# Altium footprint library Footprints.PcbLib: 207 footprints (part 2 of 13)
Each footprint in its own frame and in the unit in brackets; x right, y up, seen from the top. Pads: shape width x height; smd on the part's side, far side on the other; paste and mask are expansions set on the pad; w line width, h text height; cw(c..) or ccw(c..) is an arc to the next point about the centre after c.
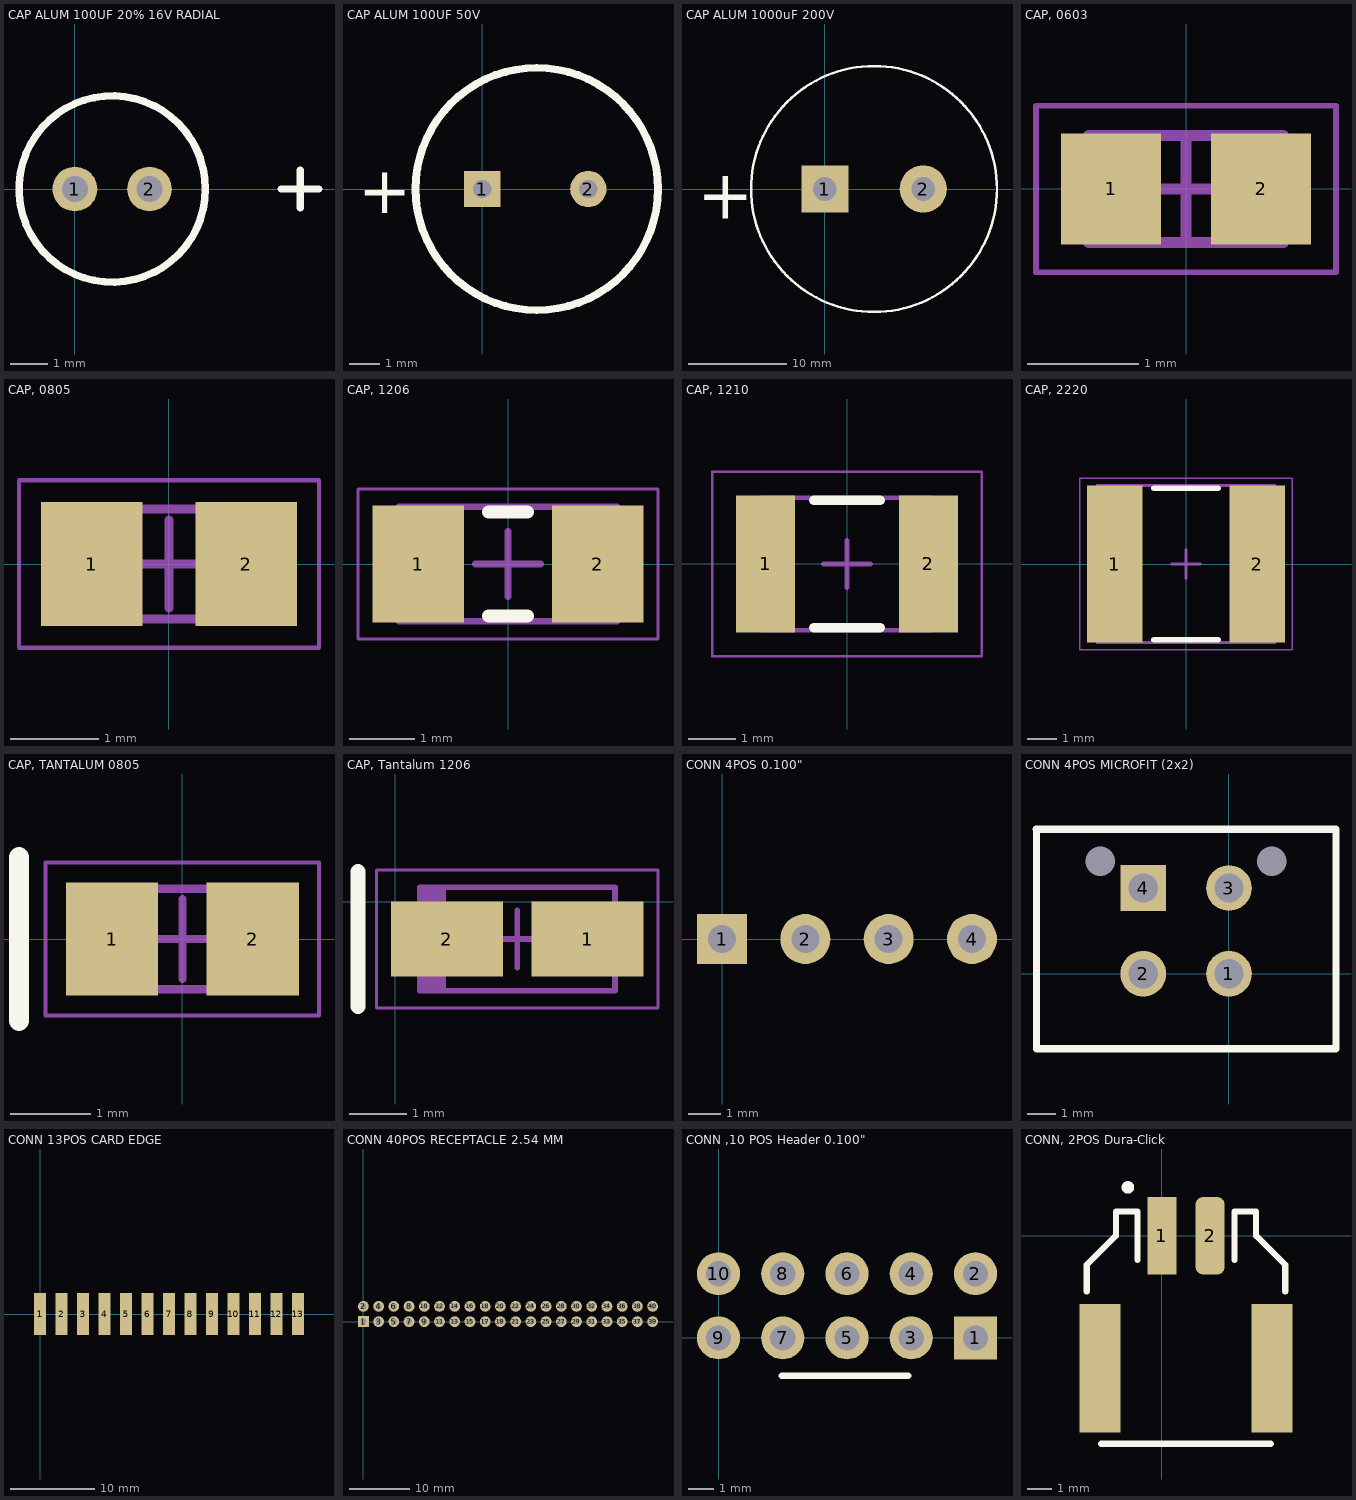
[diagram p1: the footprints below, top view; thin cyan lines are the x and y axes]

## CAP ALUM 100UF 20% 16V RADIAL [mm] "100µF 16V Aluminum Capacitors Radial, Can 2000 Hrs @ 105°C"
height 12.5
pads (2):
  round 1.2 hole 0.7: 1(0,0) 2(2,0)
Top Overlay:
  circle w0.2: c1,0 r2.5
  lines w0.2: 5.532,0 6.548,0 ; 6.04,-0.508 6.04,0.508

## CAP ALUM 100UF 50V [mm] "CAP ALUM 100UF 20% 50V RADIAL"
height 11
pads (2):
  rect 1.2x1.2 hole 0.6: 1(0,0)
  round 1.2 hole 0.6: 2(3.5,0)
Top Overlay:
  circle w0.254: c1.8,0 r4
  text "+" at -4.1,-0.8 h1.52
3D body "ESY107M050AG3AA.step": height 12.5, standoff -5, extent -2.45,-4.25 6.05,4.25

## CAP ALUM 1000uF 200V [mm] "Footprint for 1000µF 200V Aluminum Electrolytic Capacitors Radial, Can - Snap-In 199mOhm @ 120Hz 3000 Hrs @ 85°C"
height 45
pads (2):
  rect 4.8x4.8 hole 2.4: 1(0,0)
  round 4.8 hole 2.4: 2(10,0)
Top Overlay:
  circle w0.254: c5,0 r12.5
  text "+" at -13,-3 h5
3D body: height 45, standoff 0, extent -8,-12.989 18,13

## CAP, 0603 [mm] "Chip Capacitor, 2-Leads, Body 1.60x0.81mm, IPC Medium Density"
height 0.9
pads (2):
  rect 0.9x1 smd mask+0.076: 1(-0.675,0) 2(0.675,0)
Mechanical 13:
  lines w0.1: -0.875,-0.48 -0.875,0.48 0.875,0.48 0.875,-0.48 -0.875,-0.48
Mechanical 15:
  lines w0.05: -1.35,-0.75 -1.35,0.75 1.35,0.75 1.35,-0.75 -1.35,-0.75
  lines w0.1: -0.48,0 0.48,0 ; 0,-0.48 0,0.48
3D body "CAPC1608X09N.step": height 0.9, standoff 0, extent -0.875,-0.48 0.875,0.48

## CAP, 0805 [mm] "Chip Capacitor, 2-Leads, Body 2.00x1.25mm, IPC Medium Density"
height 1.25
pads (2):
  rect 1.15x1.4 smd: 1(-0.875,0) 2(0.875,0)
Mechanical 13:
  lines w0.1: -1,-0.625 1,-0.625 1,0.625 -1,0.625 -1,-0.625
Mechanical 15:
  lines w0.05: -1.7,-0.95 1.7,-0.95 1.7,0.95 -1.7,0.95 -1.7,-0.95
  lines w0.1: -0.5,0 0.5,0 ; 0,-0.5 0,0.5
3D body "CAP, 0805.step": height 1.25, standoff 0, extent -1,-0.625 1,0.625

## CAP, 1206 [mm] "Chip Capacitor, 2-Leads, Body 3.20x1.60mm, IPC Medium Density"
height 1.8
pads (2):
  rect 1.4x1.8 smd: 1(-1.375,0) 2(1.375,0)
Top Overlay:
  lines w0.2: -0.3,-0.8 0.3,-0.8 ; -0.3,0.8 0.3,0.8
Mechanical 13:
  lines w0.1: -1.675,-0.875 1.675,-0.875 1.675,0.875 -1.675,0.875 -1.675,-0.875
Mechanical 15:
  lines w0.05: -2.3,-1.15 2.3,-1.15 2.3,1.15 -2.3,1.15 -2.3,-1.15
  lines w0.1: -0.5,0 0.5,0 ; 0,-0.5 0,0.5
3D body: height 1.8, standoff 0, extent 1.125,-0.875 1.675,0.875
3D body: height 1.8, standoff 0, extent -1.675,-0.875 -1.125,0.875
3D body: height 1.8, standoff 0, extent -1.125,-0.875 1.125,0.875

## CAP, 1210 [mm] "Chip Capacitor, 2-Leads, Body 3.20x2.50mm, IPC Low Density"
height 2.8
pads (2):
  rect 1.25x2.9 smd: 1(-1.725,0) 2(1.725,0)
Top Overlay:
  lines w0.2: -0.7,-1.35 0.7,-1.35 ; -0.7,1.35 0.7,1.35
Mechanical 13:
  lines w0.1: -1.8,-1.4 1.8,-1.4 1.8,1.4 -1.8,1.4 -1.8,-1.4
Mechanical 15:
  lines w0.05: -2.85,-1.95 2.85,-1.95 2.85,1.95 -2.85,1.95 -2.85,-1.95
  lines w0.1: -0.5,0 0.5,0 ; 0,-0.5 0,0.5
3D body "CAPC3225X28M.step": height 2.8, standoff 0, extent -1.8,-1.4 1.8,1.4

## CAP, 2220 [mm] "Chip Capacitor, 2-Leads, Body 5.70x5.00mm, IPC Medium Density"
height 2.3
pads (2):
  rect 1.9x5.4 smd: 1(-2.45,0) 2(2.45,0)
Top Overlay:
  lines w0.2: -1.1,-2.6 1.1,-2.6 ; -1.1,2.6 1.1,2.6
Mechanical 13:
  lines w0.1: -3.05,-2.7 3.05,-2.7 3.05,2.7 -3.05,2.7 -3.05,-2.7
Mechanical 15:
  lines w0.05: -3.65,-2.95 3.65,-2.95 3.65,2.95 -3.65,2.95 -3.65,-2.95
  lines w0.1: -0.5,0 0.5,0 ; 0,-0.5 0,0.5
3D body: height 2.3, standoff 0, extent 2.55,-2.7 3.05,2.7
3D body: height 2.3, standoff 0, extent -3.05,-2.7 -2.55,2.7
3D body: height 2.3, standoff 0, extent -2.55,-2.7 2.55,2.7

## CAP, TANTALUM 0805 [mm] "Chip Capacitor, 2-Leads, Body 2.00x1.25mm, IPC Medium Density"
height 1.25
pads (2):
  rect 1.15x1.4 smd: 1(-0.875,0) 2(0.875,0)
Top Overlay:
  lines w0.254: -2.032,-1.016 -2.032,1.016
Mechanical 13:
  lines w0.1: -1,-0.625 1,-0.625 1,0.625 -1,0.625 -1,-0.625
Mechanical 15:
  lines w0.05: -1.7,-0.95 1.7,-0.95 1.7,0.95 -1.7,0.95 -1.7,-0.95
  lines w0.1: -0.5,0 0.5,0 ; 0,-0.5 0,0.5
3D body "CAP, 0805.step": height 1.25, standoff 0, extent -1,-0.625 1,0.625

## CAP, Tantalum 1206 [mm] "22µF ±10% Molded Tantalum Capacitors 6.3V 1206 (3216 Metric) 3 Ohm"
height 1.1
pads (2):
  rect 1.95x1.3 smd: 1(3.35,-0.65) 2(0.9,-0.65)
Top Overlay:
  lines w0.254: -0.65,-1.825 -0.65,0.525
Mechanical 13:
  region: 0.882,0.25 0.425,0.25 0.425,-1.55 0.882,-1.55
  lines w0.1: 0.425,-1.55 0.425,0.25 3.825,0.25 3.825,-1.55 0.425,-1.55
Mechanical 15:
  lines w0.05: -0.325,-1.85 -0.325,0.55 4.575,0.55 4.575,-1.85 -0.325,-1.85
  lines w0.1: 1.625,-0.65 2.625,-0.65 ; 2.125,-1.15 2.125,-0.15
3D body: height 1.1, standoff 0, extent 0.425,-1.55 3.825,0.25

## CONN 4POS 0.100" [mil]
pads (4):
  rect 60x60 hole 33.46: 1(0,0)
  round 60 hole 33.46: 2(100,0) 3(200,0) 4(300,0)
3D body "STEP-61300411121-rev1.stp": height 336.22, standoff -118.11, extent -49.99,-49.99 350.01,50.01

## CONN 4POS MICROFIT (2x2) [mm]
height 9.91
pads (6):
  round 1.6 hole 1.02: 1(0,0) 2(-3,0) 3(0,3)
  rect 1.6x1.6 hole 1.02: 4(-3,3)
  round 0 hole 1.02: ""(-4.5,3.94) ""(1.5,3.94)
Top Overlay:
  lines w0.254: -6.75,5.06 -4.13,5.06 1.11,5.06 3.73,5.06 ; -6.735,5.06 -6.735,-2.625 -3.401,-2.625 -2.457,-2.625 -1.985,-2.625 -1.041,-2.625 -0.569,-2.625 0.374,-2.625 3.745,-2.625 3.745,5.06
3D body "430450427.stp": height 9.91, standoff -3.18, extent -6.575,-2.475 3.575,6.295

## CONN 13POS CARD EDGE [mm]
pads (13):
  rect 1.4x5 smd: 1(0,0) 2(2.54,0) 3(5.08,0) 4(7.62,0) 5(10.16,0) 6(12.7,0) 7(15.24,0) 8(17.78,0) 9(20.32,0) 10(22.86,0) 11(25.4,0) 12(27.94,0) 13(30.48,0)

## CONN 40POS RECEPTACLE 2.54 MM [mm] "gpio header for raspberry pi"
pads (40):
  rect 1.8x1.8 hole 1: 1(0,0)
  round 1.8 hole 1: 2(0,2.54) 3(2.54,0) 4(2.54,2.54) 5(5.08,0) 6(5.08,2.54) 7(7.62,0) 8(7.62,2.54) 9(10.16,0) 10(10.16,2.54) 11(12.7,0) 12(12.7,2.54) 13(15.24,0) 14(15.24,2.54) 15(17.78,0) 16(17.78,2.54) 17(20.32,0) 18(20.32,2.54) 19(22.86,0) 20(22.86,2.54) 21(25.4,0) 22(25.4,2.54) 23(27.94,0) 24(27.94,2.54) 25(30.48,0) 26(30.48,2.54) 27(33.02,0) 28(33.02,2.54) 29(35.56,0) 30(35.56,2.54) 31(38.1,0) 32(38.1,2.54) 33(40.64,0) 34(40.64,2.54) 35(43.18,0) 36(43.18,2.54) 37(45.72,0) 38(45.72,2.54) 39(48.26,0) 40(48.26,2.54)
3D body "015445840.stp": height 2.55, standoff -9.14, extent -1.275,-1.277 49.5,3.777
3D body: height 0.25, standoff 0, extent -2.02,4.52 -2.02,4.52

## CONN ,10 POS Header 0.100" [mm]
pads (10):
  rect 1.7x1.7 hole 1: 1(10.16,0)
  round 1.7 hole 1: 2(10.16,2.54) 3(7.62,0) 4(7.62,2.54) 5(5.08,0) 6(5.08,2.54) 7(2.54,0) 8(2.54,2.54) 9(0,0) 10(0,2.54)
Top Overlay:
  lines w0.254: 2.5,-1.5 7.5,-1.5

## CONN, 2POS Dura-Click [mm] "WM7169CT-ND"
pads (4):
  rect 1.2x3.2 smd: 1(0,0)
  rrect50% 1.2x3.2 smd: 2(2,0)
  rect 1.7x5.3 smd: ""(-2.55,-5.48) ""(4.55,-5.48)
Top Overlay:
  circle w0.26: c-1.4,2 r0.13
  lines w0.254: -3.1,-2.3 -3.1,-1.2 -1.9,0 -1.9,1 -1,1 -1,-1 ; -2.5,-8.6 4.5,-8.6 ; 3,-1 3,1 3.9,1 3.9,0 5.1,-1.2 5.1,-2.3
3D body "5023520200.stp": height 6.39, standoff -0.01, extent -3,-8.4 5,1